# Altium footprint library DM2097_R1M1E1.PcbLib: 70 footprints (part 4 of 5)
Each footprint in its own frame and in the unit in brackets; x right, y up, seen from the top. Pads: shape width x height; smd on the part's side, far side on the other; paste and mask are expansions set on the pad; w line width, h text height; cw(c..) or ccw(c..) is an arc to the next point about the centre after c.
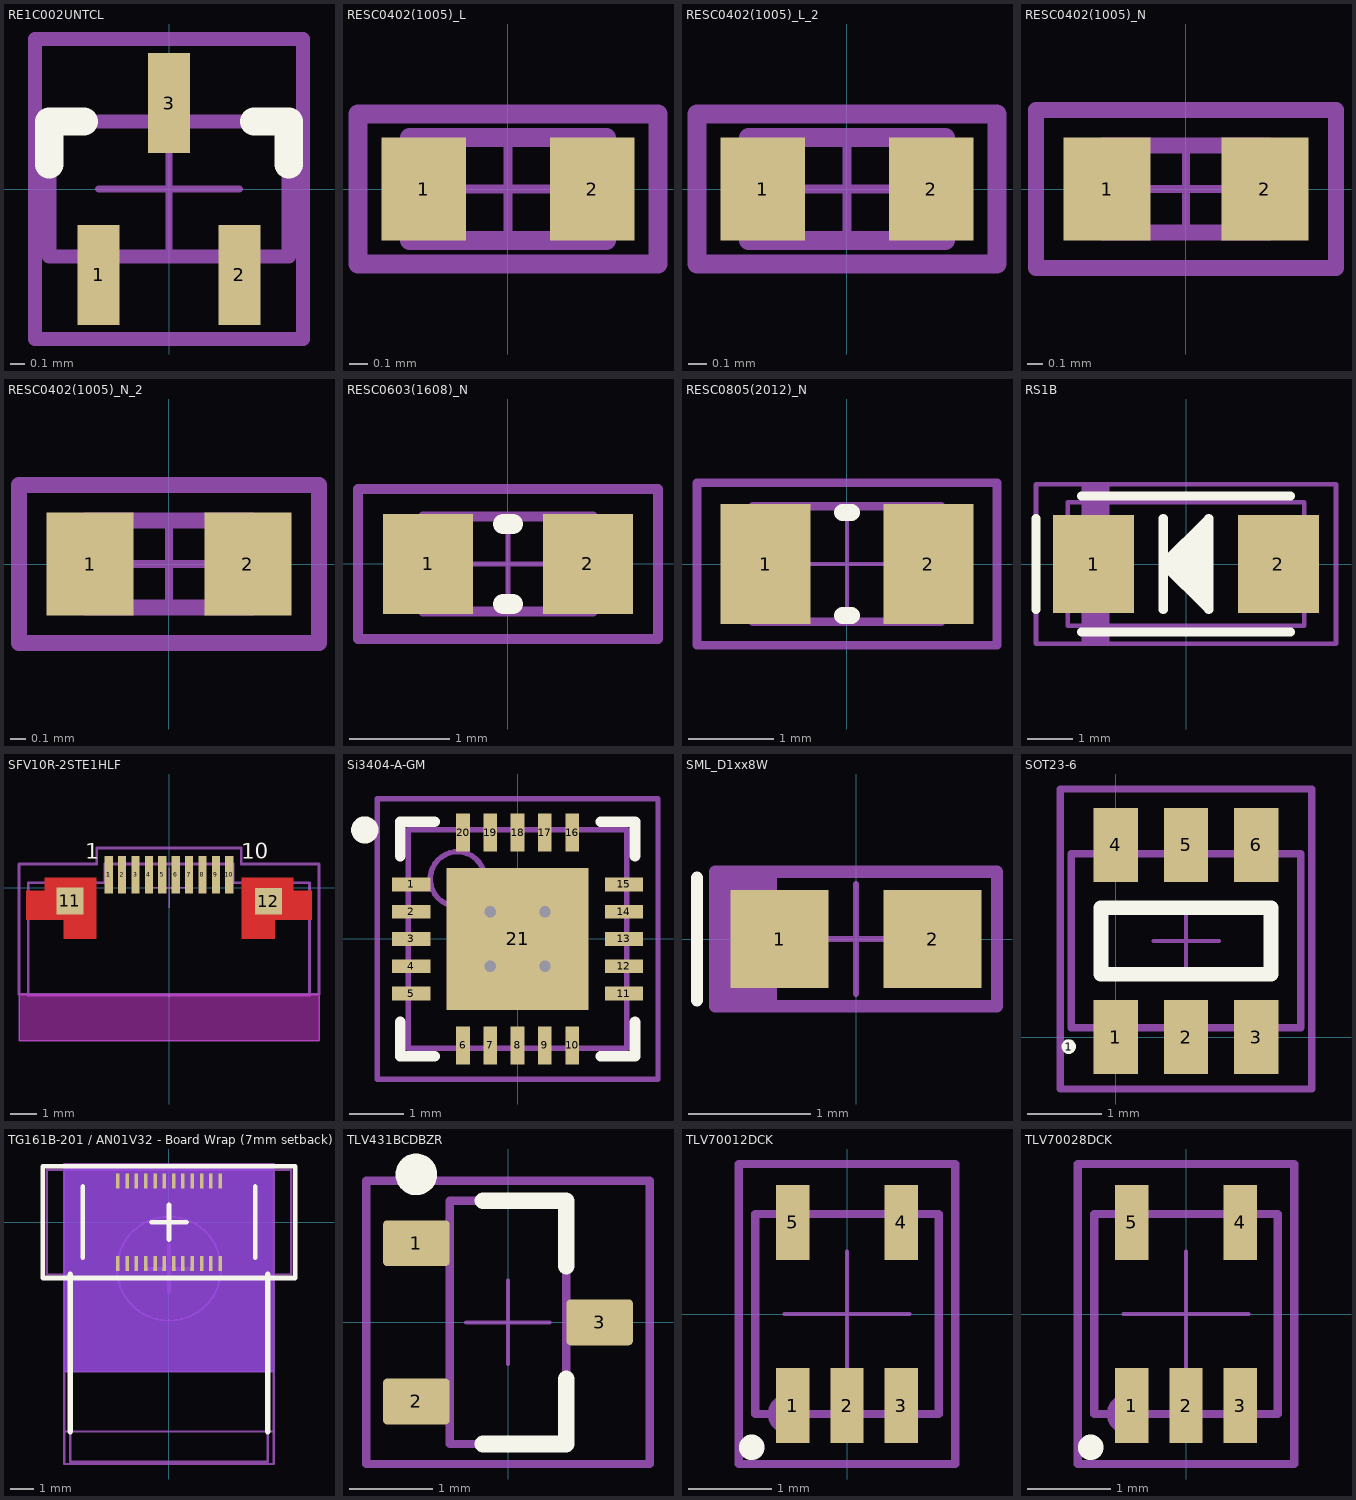
[diagram p3: the footprints below, top view; thin cyan lines are the x and y axes]

## RE1C002UNTCL [mm] "ROHM SOT-416FL"
height 0.85
pads (3):
  rect 0.3x0.71 smd: 1(-0.5,-0.61) 2(0.5,-0.61) 3(0,0.61)
Top Overlay:
  lines w0.2: -0.85,0.175 -0.85,0.48 -0.605,0.48 ; 0.605,0.48 0.85,0.48 0.85,0.175
Top Assembly:
  lines w0.1: -0.95,-1.065 0.95,-1.065 0.95,1.065 -0.95,1.065 -0.95,-1.065
  text "'.Designator'" at 0,0 h1
Top Courtyard:
  lines w0.05: -0.5,0 0.5,0 ; 0,-0.5 0,0.5 ; -0.95,-1.065 -0.95,1.065 0.95,1.065 0.95,-1.065 -0.95,-1.065
Top Component Outline:
  lines w0.1: -0.85,-0.48 0.85,-0.48 0.85,0.48 -0.85,0.48 -0.85,-0.48
3D body "Trans_ROHM_RE1C002UNTCL_eec.STEP": height 0.25, standoff 0, extent -0.95,-1.065 0.95,1.065

## RESC0402(1005)_L [mm] "Chip Resistor, Body 1.0x0.5mm, IPC High Density"
height 0.4
pads (2):
  rect 0.45x0.55 smd: 1(-0.45,0) 2(0.45,0)
Top Assembly:
  lines w0.1: -0.8,-0.4 -0.8,0.4 0.8,0.4 0.8,-0.4 -0.8,-0.4
  text "'.Designator'" at 0,0 h1
Top Courtyard:
  lines w0.05: -0.275,0 0.275,0 ; 0,-0.275 0,0.275 ; -0.8,-0.4 -0.8,0.4 0.8,0.4 0.8,-0.4 -0.8,-0.4
Top Component Outline:
  lines w0.1: -0.525,-0.275 0.525,-0.275 0.525,0.275 -0.525,0.275 -0.525,-0.275
3D body: height 0.4, standoff 0, extent 0.3,-0.275 0.525,0.275
3D body: height 0.4, standoff 0, extent -0.3,-0.275 0.3,0.275
3D body: height 0.4, standoff 0, extent -0.525,-0.275 -0.3,0.275

## RESC0402(1005)_L_2 [mm]
pads (2):
  rect 0.45x0.55 smd: 1(-0.45,0) 2(0.45,0)
Top Assembly:
  lines w0.1: -0.8,-0.4 0.8,-0.4 0.8,0.4 -0.8,0.4 -0.8,-0.4
  text "'.Designator'" at 0,0 h1
Top Courtyard:
  lines w0.05: -0.275,0 0.275,0 ; 0,-0.275 0,0.275 ; -0.8,-0.4 0.8,-0.4 0.8,0.4 -0.8,0.4 -0.8,-0.4
Top Component Outline:
  lines w0.1: -0.525,-0.275 -0.525,0.275 0.525,0.275 0.525,-0.275 -0.525,-0.275
3D body: height 0.4, standoff 0, extent -0.525,-0.275 -0.3,0.275
3D body: height 0.4, standoff 0, extent -0.3,-0.275 0.3,0.275
3D body: height 0.4, standoff 0, extent 0.3,-0.275 0.525,0.275

## RESC0402(1005)_N [mm] "Chip Resistor, Body 1.0x0.5mm, IPC Medium Density"
height 0.4
pads (2):
  rect 0.55x0.65 smd: 1(-0.5,0) 2(0.5,0)
Top Assembly:
  lines w0.1: -0.95,-0.5 -0.95,0.5 0.95,0.5 0.95,-0.5 -0.95,-0.5
  text "'.Designator'" at 0,0 h1
Top Courtyard:
  lines w0.05: -0.275,0 0.275,0 ; 0,-0.275 0,0.275 ; -0.95,-0.5 -0.95,0.5 0.95,0.5 0.95,-0.5 -0.95,-0.5
Top Component Outline:
  lines w0.1: -0.525,-0.275 0.525,-0.275 0.525,0.275 -0.525,0.275 -0.525,-0.275
3D body: height 0.4, standoff 0, extent -0.525,-0.275 -0.3,0.275
3D body: height 0.4, standoff 0, extent -0.3,-0.275 0.3,0.275
3D body: height 0.4, standoff 0, extent 0.3,-0.275 0.525,0.275

## RESC0402(1005)_N_2 [mm]
pads (2):
  rect 0.55x0.65 smd: 1(-0.5,0) 2(0.5,0)
Top Assembly:
  lines w0.1: -0.95,-0.5 0.95,-0.5 0.95,0.5 -0.95,0.5 -0.95,-0.5
  text "'.Designator'" at 0,0 h1
Top Courtyard:
  lines w0.05: -0.275,0 0.275,0 ; 0,-0.275 0,0.275 ; -0.95,-0.5 0.95,-0.5 0.95,0.5 -0.95,0.5 -0.95,-0.5
Top Component Outline:
  lines w0.1: -0.525,-0.275 -0.525,0.275 0.525,0.275 0.525,-0.275 -0.525,-0.275
3D body: height 0.4, standoff 0, extent 0.3,-0.275 0.525,0.275
3D body: height 0.4, standoff 0, extent -0.3,-0.275 0.3,0.275
3D body: height 0.4, standoff 0, extent -0.525,-0.275 -0.3,0.275

## RESC0603(1608)_N [mm] "Chip Resistor, Body 1.6x0.8mm, IPC Medium Density"
height 0.6
pads (2):
  rect 0.9x1 smd: 1(-0.8,0) 2(0.8,0)
Top Overlay:
  lines w0.2: -0.05,-0.4 0.05,-0.4 ; -0.05,0.4 0.05,0.4
Top Assembly:
  lines w0.1: -1.5,-0.75 1.5,-0.75 1.5,0.75 -1.5,0.75 -1.5,-0.75
  text "'.Designator'" at 0,0 h1
Top Courtyard:
  lines w0.05: -0.475,0 0.475,0 ; 0,-0.475 0,0.475 ; -1.5,-0.75 1.5,-0.75 1.5,0.75 -1.5,0.75 -1.5,-0.75
Top Component Outline:
  lines w0.1: -0.85,-0.475 -0.85,0.475 0.85,0.475 0.85,-0.475 -0.85,-0.475
3D body: height 0.6, standoff 0, extent 0.581,-0.474 0.85,0.475
3D body: height 0.6, standoff 0, extent -0.58,-0.474 0.581,0.475
3D body: height 0.6, standoff 0, extent -0.849,-0.474 -0.58,0.475

## RESC0805(2012)_N [mm] "Chip Resistor, Body 2.0x1.3mm, IPC Medium Density"
height 0.7
pads (2):
  rect 1.05x1.4 smd: 1(-0.95,0) 2(0.95,0)
Top Overlay:
  lines w0.2: -0.05,-0.6 0.05,-0.6 ; -0.05,0.6 0.05,0.6
Top Assembly:
  lines w0.1: -1.75,-0.95 -1.75,0.95 1.75,0.95 1.75,-0.95 -1.75,-0.95
  text "'.Designator'" at 0,0 h1
Top Courtyard:
  lines w0.05: -0.5,0 0.5,0 ; 0,-0.5 0,0.5 ; -1.75,-0.95 1.75,-0.95 1.75,0.95 -1.75,0.95 -1.75,-0.95
Top Component Outline:
  lines w0.1: -1.1,-0.675 1.1,-0.675 1.1,0.675 -1.1,0.675 -1.1,-0.675
3D body: height 0.7, standoff 0, extent 0.68,-0.675 1.1,0.675
3D body: height 0.7, standoff 0, extent -0.68,-0.675 0.68,0.675
3D body: height 0.7, standoff 0, extent -1.1,-0.675 -0.68,0.675

## RS1B [mil] "Molded Diode, 2-Leads, Body 4.30x2.59mm, IPC Medium Density"
height 106.3
pads (2):
  rect 70x85 smd: 1(-80,0) 2(80,0)
Top Overlay:
  pour cut-out: -19.69,39.37 -19.69,0
  region: 19.69,-39.37 19.69,39.37 -19.68,0
  lines w3.94: -19.68,0 0,-19.68
  lines w7.87: -129.92,-39.37 -129.92,39.37 ; -90.55,-59.06 90.55,-59.06 ; -90.55,59.06 90.55,59.06 ; -19.68,-39.37 -19.68,39.37 ; -19.68,0 19.69,39.37 19.69,-39.37 -19.68,0
Top Assembly:
  region: -66.19,68.9 -90.55,68.9 -90.55,-68.9 -66.19,-68.9
  lines w3.94: -129.92,-68.9 -129.92,68.9 129.92,68.9 129.92,-68.9 -129.92,-68.9
  text "'.Designator'" at 0,0 h39.37
Top Courtyard:
  lines w1.97: -19.68,0 19.69,0 ; 0,-19.68 0,19.69 ; -129.92,-68.9 129.92,-68.9 129.92,68.9 -129.92,68.9 -129.92,-68.9
Top Component Outline:
  lines w3.94: -102.36,-53.64 102.36,-53.64 102.36,53.64 -102.36,53.64 -102.36,-53.64
3D body "S1G--3DModel-STEP-56544.STEP": height 106.3, standoff 0, extent -102.36,-53.64 102.36,53.64

## SFV10R-2STE1HLF [mm] "CONN FFC TOP 10POS 0.50MM R/A"
height 2
pads (13):
  rect 0.305x1.405 smd: 1(-2.258,0.494) 1(-2.258,0.494) 2(-1.759,0.494) 3(-1.258,0.494) 4(-0.758,0.494) 5(-0.258,0.494) 6(0.242,0.494) 7(0.741,0.494) 8(1.242,0.494) 9(1.742,0.494) 10(2.242,0.494)
  rect 1x1 smd: 11(-3.707,-0.486) 12(3.708,-0.494)
Top Layer:
  region: 3.942,0.396 2.692,0.396 2.692,-1.904 3.942,-1.904
  region: 5.342,-0.105 2.692,-0.105 2.692,-1.205 5.342,-1.205
  region: 4.642,0.395 2.692,0.395 2.692,-1.205 4.642,-1.205
  rectangle: -4.658,-1.205 -2.708,0.395
  rectangle: -5.358,-1.205 -2.708,-0.105
  rectangle: -3.957,-1.906 -2.707,0.394
Top Overlay:
  text "10" at 2.694,0.892 h1
  text "1" at -3.137,0.892 h1
Top Paste:
  region: 5.342,-0.105 2.692,-0.105 2.692,-1.205 5.342,-1.205
  region: 4.642,0.395 2.692,0.395 2.692,-1.205 4.642,-1.205
  region: 3.942,0.396 2.692,0.396 2.692,-1.904 3.942,-1.904
  rectangle: -5.358,-1.205 -2.708,-0.105
  rectangle: -4.658,-1.205 -2.708,0.395
  rectangle: -3.957,-1.906 -2.707,0.394
Keep-Out Layer:
  region: 5.594,-5.708 5.594,-3.973 -5.611,-3.973 -5.611,-5.708
Top Assembly:
  lines w0.1: -5.611,-3.973 -5.611,0.892 -2.711,0.892 -2.711,1.492 2.694,1.492 2.694,0.892 5.594,0.892 5.594,-3.973 -5.611,-3.973
  text "'.Designator'" at 0,0 h1
Mechanical 10:
  text "Top contact ffc" at -2.756,-3.708 h1
Top Courtyard:
  lines w0.05: -0.75,0 0,0 ; 0,-0.75 0,0 ; 0,0.75 0,0 ; 0.75,0 0,0 ; -5.611,-5.708 -5.611,0.892 -5.261,0.892 -2.711,0.892 -2.711,1.492 2.694,1.492 2.694,0.892 5.244,0.892 5.594,0.892 5.594,-5.708 -5.611,-5.708
Top Component Outline:
  lines w0.1: 5.239,0.192 5.239,-4.008 -5.261,-4.008 -5.261,0.192 -2.411,0.192 -2.411,0.892 2.394,0.892 2.394,0.192 5.244,0.192
3D body "ssfv10r_2stlf.stp": height 1.82, standoff -0.05, extent -5.261,-4.008 5.239,0.892

## Si3404-A-GM [mm] "QFN, 20-Leads, Body 4.00x4.00mm, Pitch 0.50mm, Thermal Pad 2.60x2.60mm, IPC Medium Density"
height 0.9
pads (21):
  rect 0.7x0.25 smd: 1(-1.95,1) 2(-1.95,0.5) 3(-1.95,0) 4(-1.95,-0.5) 5(-1.95,-1) 11(1.95,-1) 12(1.95,-0.5) 13(1.95,0) 14(1.95,0.5) 15(1.95,1)
  rect 0.25x0.7 smd: 6(-1,-1.95) 7(-0.5,-1.95) 8(0,-1.95) 9(0.5,-1.95) 10(1,-1.95) 16(1,1.95) 17(0.5,1.95) 18(0,1.95) 19(-0.5,1.95) 20(-1,1.95)
  rect 2.6x2.6 smd paste-5: 21(0,0)
via 0.5,0.5 diameter 0.406 hole 0.203
via -0.5,0.5 diameter 0.406 hole 0.203
via -0.5,-0.5 diameter 0.406 hole 0.203
via 0.5,-0.5 diameter 0.406 hole 0.203
Top Overlay:
  circle w0.25: c-2.8,2 r0.125
  lines w0.2: -2.15,-1.525 -2.15,-2.15 -1.525,-2.15 ; -2.15,1.525 -2.15,2.15 -1.525,2.15 ; 1.525,-2.15 2.15,-2.15 2.15,-1.525 ; 1.525,2.15 2.15,2.15 2.15,1.525
Top Paste:
  region: -0.7,-1.3 -1.3,-1.3 -1.3,-0.7 -0.7,-0.7
  region: -1.3,0.7 -1.3,1.3 -0.7,1.3 -0.7,0.7
  region: 0.7,1.3 1.3,1.3 1.3,0.7 0.7,0.7
  region: 1.3,-0.7 1.3,-1.3 0.7,-1.3 0.7,-0.7
  region: 0.3,-0.7 0.3,-1.3 -0.3,-1.3 -0.3,-0.7
  region: -0.7,-0.3 -1.3,-0.3 -1.3,0.3 -0.7,0.3
  region: -0.3,0.7 -0.3,1.3 0.3,1.3 0.3,0.7
  region: 0.7,0.3 1.3,0.3 1.3,-0.3 0.7,-0.3
  region: -0.3,0.3 0.3,0.3 0.3,-0.3 -0.3,-0.3
Top Assembly:
  circle w0.1: c-1.1,1.1 r0.5
  lines w0.1: -2.575,-2.575 -2.575,2.575 2.575,2.575 2.575,-2.575 -2.575,-2.575
  text "'.Designator'" at 0,0 h1
Top Courtyard:
  lines w0.05: -0.5,0 0.5,0 ; 0,-0.5 0,0.5 ; -2.575,-2.575 -2.575,2.575 2.575,2.575 2.575,-2.575 -2.575,-2.575
Top Component Outline:
  lines w0.1: -2.001,-2.001 -2.001,2.001 2.001,2.001 2.001,-2.001 -2.001,-2.001
3D body "Si3404-A-GM.step": height 0.9, standoff 0, extent -2.001,-2.001 2.001,2.001

## SML_D1xx8W [mm] "Rohm LED SML_D1 series - Chip Diode, 2-Leads, Body 1.60x0.80mm, IPC High Density"
height 0.55
pads (2):
  rect 0.8x0.8 smd: 1(-0.625,0) 2(0.625,0)
Top Overlay:
  lines w0.1: -1.3,-0.5 -1.3,0.5
Top Assembly:
  rectangle: -1.15,-0.55 -0.698,0.55
  lines w0.1: -0.698,-0.55 -0.698,0.55 ; -1.15,-0.55 1.15,-0.55 1.15,0.55 -1.15,0.55 -1.15,-0.55
  text "'.Designator'" at 0,0 h1
Top Courtyard:
  lines w0.05: -0.45,0 0.45,0 ; 0,-0.45 0,0.45 ; -1.15,-0.55 1.15,-0.55 1.15,0.55 -1.15,0.55 -1.15,-0.55
3D body "User Library-LED_0603_WS.STEP": height 0.6, standoff 0, extent -0.8,-0.4 0.8,0.4

## SOT23-6 [mm]
pads (7):
  round 0.2 on Top Overlay: 1(-0.635,-0.127)
  rect 0.6x1 smd: 1(0,0) 2(0.95,0) 3(1.9,0) 4(0,2.6) 5(0.95,2.6) 6(1.9,2.6)
Top Overlay:
  lines w0.2: -0.2,0.85 -0.2,1.75 2.1,1.75 2.1,0.85 -0.2,0.85
Top Assembly:
  lines w0.1: -0.75,-0.7 -0.75,3.354 0.35,3.354 1.55,3.354 2.65,3.354 2.65,-0.7 -0.75,-0.7
  text "'.Designator'" at 0.95,1.175 h1
Top Courtyard:
  lines w0.05: 0.508,1.3 0.95,1.3 1.397,1.3 ; 0.95,0.95 0.95,1.175 ; 0.951,1.713 0.951,1.175 ; 0.95,1.175 0.95,1.175 ; -0.75,-0.7 2.65,-0.7 2.65,3.354 1.55,3.354 0.35,3.354 -0.75,3.354 -0.75,-0.7
Top Component Outline:
  lines w0.1: -0.6,0.127 2.5,0.127 2.5,2.478 -0.6,2.478 -0.6,0.127
3D body "SOT236.step": height 1, standoff 0, extent -0.51,0.13 2.41,2.47

## TG161B-201 / AN01V32 - Board Wrap (7mm setback) MinPads [mm] "SMT connector: BBR43-24KB533, 7mm camera setback"
pads (24):
  rect 0.15x0.65 smd mask+0.05: 1(2.2,-1.775) 2(1.8,-1.775) 3(1.4,-1.775) 4(1,-1.775) 5(0.6,-1.775) 6(0.2,-1.775) 7(-0.2,-1.775) 8(-0.6,-1.775) 9(-1,-1.775) 10(-1.4,-1.775) 11(-1.8,-1.775) 12(-2.2,-1.775) 13(-2.2,1.775) 14(-1.8,1.775) 15(-1.4,1.775) 16(-1,1.775) 17(-0.6,1.775) 18(-0.2,1.775) 19(0.2,1.775) 20(0.6,1.775) 21(1,1.775) 22(1.4,1.775) 23(1.8,1.775) 24(2.2,1.775)
Bottom Layer keep-out:
  region: 4.5,2.5 -4.5,2.5 -4.5,-6.425 4.5,-6.425
Top Overlay:
  lines w0.2: -3.705,-1.53 -3.705,1.53 ; -0.75,0 0,0 ; 0,-0.75 0,0 ; 0,0.75 0,0 ; 0.75,0 0,0 ; 3.705,-1.53 3.705,1.53 ; -5.425,-2.4 5.425,-2.4 5.425,2.4 -5.425,2.4 -5.425,-2.4
  lines w0.25: -4.25,-9 -4.25,-2.25 ; 4.25,-9 4.25,-2.25
Bottom Overlay:
  lines w0.25: -4.25,-9 -4.25,-6.25 ; 4.25,-9 4.25,-6.25 ; -4.25,-6.25 4.25,-6.25 ; -4.25,-6.25 -4.25,2.25 4.25,2.25 4.25,-6.25
Top Assembly:
  lines w0.1: -4.5,-2.425 -4.5,-9 ; 4.5,-2.425 4.5,-9 ; -4.5,-9 -4.5,-10.4 4.5,-10.4 4.5,-9 ; -4.5,-9 4.5,-9 ; 4.5,-9 4.5,-9 ; -5.425,-2.425 5.425,-2.425 5.425,2.425 -5.425,2.425 -5.425,-2.425
  text "'.Designator'" at 0,0 h1
  text "Board edge" at -1.1,-8.9 h0.5
  text "Flex edge" at -0.9,-10.3 h0.5
Bottom Assembly:
  circle w0.1: c0,-2 r2.236
  lines w0.1: -4.5,-9 4.5,-9 ; -4.5,-9 -4.5,2.5 4.5,2.5 4.5,-9 ; -4.5,-9 -4.5,-10.4 4.5,-10.4 4.5,-9
  lines w0.2: -1,-2 1,-2 ; 0,-3 0,-1
  text "Board edge" at 1.1,-8.9 h0.5
  text "Flex edge" at 0.9,-10.3 h0.5
Top Courtyard:
  lines w0.05: -4.5,-9 -4.5,-2.425 ; -0.8,0 0.8,0 ; 0,-0.8 0,0.8 ; 4.5,-9 4.5,-2.425 ; -5.425,-2.425 5.425,-2.425 5.425,2.425 -5.425,2.425 -5.425,-2.425
Bottom Courtyard:
  lines w0.05: -4.5,-9 -4.5,2.5 4.5,2.5 4.5,-9
Top Component Outline:
  lines w0.1: -5.25,-2.25 -5.25,2.25 5.25,2.25 5.25,-2.25 4.25,-2.25 4.25,-10.31 -4.25,-10.31 -4.25,-2.25 -5.25,-2.25
Bottom Component Outline:
  lines w0.1: -4.5,-6.425 -4.5,2.5 4.5,2.5 4.5,-6.425 -4.5,-6.425
3D body: height 0.94, standoff 0.84, extent -4.25,-10.31 4.25,-2.25
3D body: height 0.94, standoff 0.84, extent -5.25,-2.25 5.25,2.25
3D body: height 5.1, standoff 1.7, extent -3.25,-5.247 3.25,1.247
3D body: height 3.4, standoff 1.7, extent -4.25,-6.25 4.25,2.25
3D body: height 0.34, standoff 0.24, extent -4.25,-10.31 4.25,-6.25
3D body: height 0.94, standoff -1.94, extent -4.25,-10.41 4.25,-10.31
3D body: height 6.1, standoff 1.7, extent -2.75,-4.75 2.75,0.75

## TLV431BCDBZR [mm] "SOT-23-3"
height 1.12
pads (3):
  rrect18% 0.8x0.55 smd: 1(-1.1,0.95) 2(-1.1,-0.95) 3(1.1,0)
Top Overlay:
  circle w0.25: c-1.1,1.775 r0.125
  lines w0.2: -0.3,-1.461 0.7,-1.461 0.7,-0.675 ; -0.3,1.46 0.7,1.46 0.7,0.675
Top Assembly:
  lines w0.1: -1.7,-1.7 1.7,-1.7 1.7,1.7 -1.7,1.7 -1.7,-1.7
  text "'.Designator'" at 0,0 h1
Top Courtyard:
  lines w0.05: -0.5,0 0.5,0 ; 0,-0.5 0,0.5 ; -1.7,-1.7 -1.7,1.7 1.7,1.7 1.7,-1.7 -1.7,-1.7
Top Component Outline:
  lines w0.1: -0.7,-1.461 -0.7,1.46 0.7,1.46 0.7,-1.461 -0.7,-1.461
3D body "DBZ0003AakaMF03A.stp": height 0.96, standoff -0.02, extent -1.257,-1.461 1.257,1.46

## TLV70012DCK [mm] "SC70-5 1.1mm"
height 1.1
pads (5):
  rect 0.4x0.9 smd paste-0.025 mask+0.05: 1(-0.65,-1.1) 2(0,-1.1) 3(0.65,-1.1) 4(0.65,1.1) 5(-0.65,1.1)
Top Overlay:
  circle w0.254: c-1.143,-1.6 r0.025
Top Assembly:
  circle w0.1: c-0.7,-1.2 r0.2
  lines w0.1: -1.3,-1.8 1.3,-1.8 1.3,1.8 -1.3,1.8 -1.3,-1.8
  text "'.Designator'" at 0,0 h1
Top Courtyard:
  lines w0.05: -0.75,0 0,0 ; 0,-0.75 0,0 ; 0,0.75 0,0 ; 0.75,0 0,0 ; -1.3,-1.8 -1.3,1.8 1.3,1.8 1.3,-1.8 -1.3,-1.8
Top Component Outline:
  lines w0.1: -1.1,-1.2 -1.1,1.2 1.1,1.2 1.1,-1.2 -1.1,-1.2
3D body "User Library-SOT353-1.step": height 1.1, standoff 0, extent -1.1,-1.2 1.1,1.2

## TLV70028DCK [mm] "SC70-5 1.1mm"
height 1.1
pads (5):
  rect 0.4x0.9 smd paste-0.025 mask+0.05: 1(-0.65,-1.1) 2(0,-1.1) 3(0.65,-1.1) 4(0.65,1.1) 5(-0.65,1.1)
Top Overlay:
  circle w0.254: c-1.143,-1.6 r0.025
Top Assembly:
  circle w0.1: c-0.7,-1.2 r0.2
  lines w0.1: -1.3,-1.8 -1.3,1.8 1.3,1.8 1.3,-1.8 -1.3,-1.8
  text "'.Designator'" at 0,0 h1
Top Courtyard:
  lines w0.05: -0.75,0 0,0 ; 0,-0.75 0,0 ; 0,0.75 0,0 ; 0.75,0 0,0 ; -1.3,-1.8 1.3,-1.8 1.3,1.8 -1.3,1.8 -1.3,-1.8
Top Component Outline:
  lines w0.1: -1.1,-1.2 1.1,-1.2 1.1,1.2 -1.1,1.2 -1.1,-1.2
3D body "User Library-SOT353-1.step": height 1.1, standoff 0, extent -1.1,-1.2 1.1,1.2